# Altium footprint library Supernova.PcbLib: 77 footprints (part 6 of 6)
Each footprint in its own frame and in the unit in brackets; x right, y up, seen from the top. Pads: shape width x height; smd on the part's side, far side on the other; paste and mask are expansions set on the pad; w line width, h text height; cw(c..) or ccw(c..) is an arc to the next point about the centre after c.
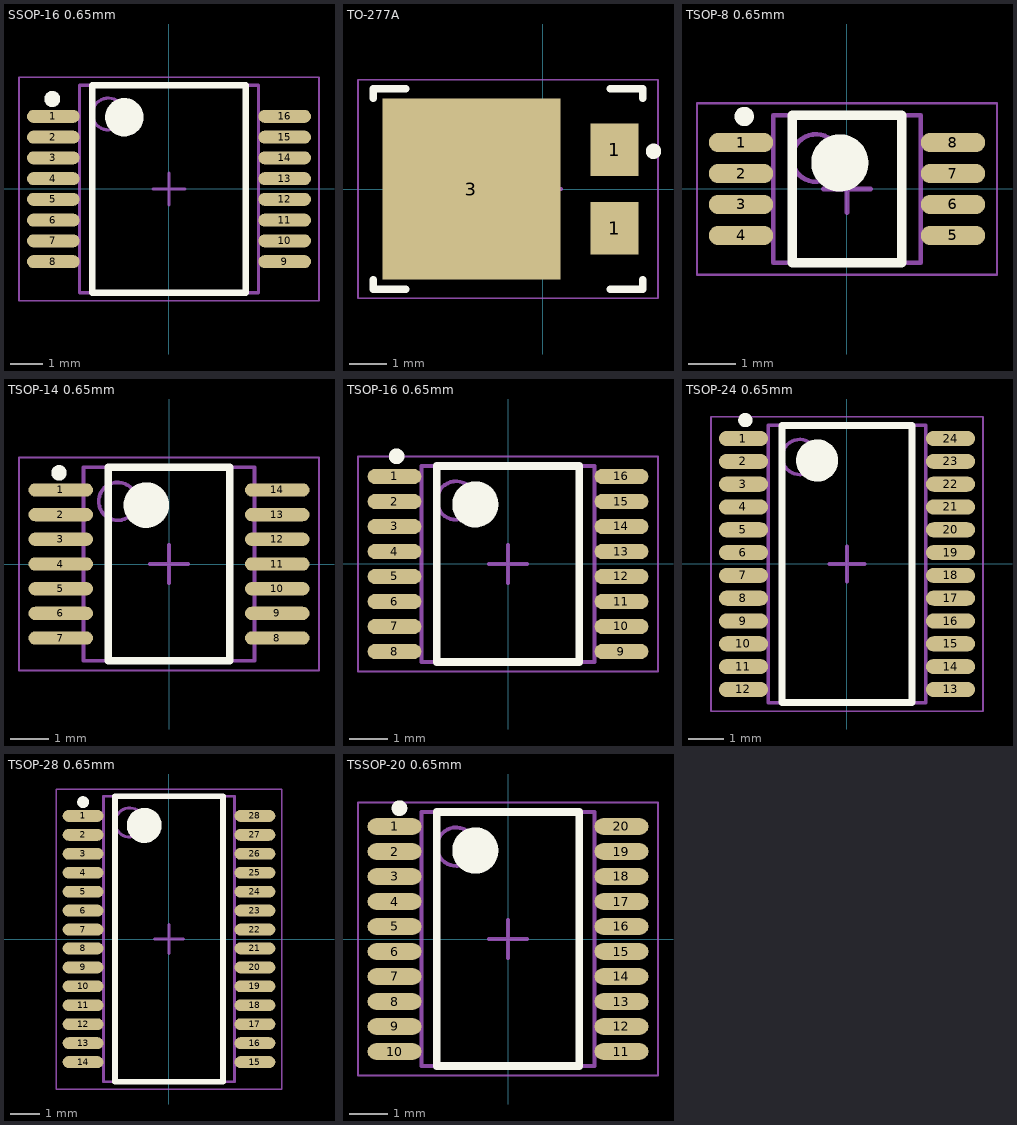
[diagram p5: the footprints below, top view; thin cyan lines are the x and y axes]

## SSOP-16 0.65mm [mm] "SOP, 16-Leads, Body 6.20x5.30mm, Pitch 0.65mm, IPC Medium Density"
height 2
pads (16):
  oval 1.65x0.406 smd mask+0.025: 1(-3.625,2.275) 2(-3.625,1.625) 3(-3.625,0.975) 4(-3.625,0.325) 5(-3.625,-0.325) 6(-3.625,-0.975) 7(-3.625,-1.625) 8(-3.625,-2.275) 9(3.625,-2.275) 10(3.625,-1.625) 11(3.625,-0.975) 12(3.625,-0.325) 13(3.625,0.325) 14(3.625,0.975) 15(3.625,1.625) 16(3.625,2.275)
Top Overlay:
  circle w0.6: c-1.4,2.25 r0.3
  circle w0.25: c-3.658,2.819 r0.125
  lines w0.2: -2.4,-3.25 2.4,-3.25 2.4,3.25 -2.4,3.25 -2.4,-3.25
Top 3D Body:
  circle w0.1: c-1.9,2.35 r0.5
  lines w0.1: -2.8,-3.25 2.8,-3.25 2.8,3.25 -2.8,3.25 -2.8,-3.25
Top Courtyard:
  lines w0.05: -4.7,-3.5 4.7,-3.5 4.7,3.5 -4.7,3.5 -4.7,-3.5
  lines w0.1: -0.5,0 0.5,0 ; 0,-0.5 0,0.5
3D body: height 0.2, standoff 0, extent -4,-2.45 4,-2.1
3D body: height 0.2, standoff 0, extent -4,-1.8 4,-1.45
3D body: height 0.2, standoff 0, extent -4,-1.15 4,-0.8
3D body: height 0.2, standoff 0, extent -4,-0.5 4,-0.15
3D body: height 0.2, standoff 0, extent -4,2.1 4,2.45
3D body: height 0.2, standoff 0, extent -4,1.45 4,1.8
3D body: height 0.2, standoff 0, extent -4,0.8 4,1.15
3D body: height 2, standoff 0.05, extent -2.8,-3.25 2.8,3.25
3D body: height 0.2, standoff 0, extent -4,0.15 4,0.5

## TO-277A [mm]
pads (3):
  rect 1.27x1.4 smd paste-0.1: 1(1.903,-1.04) 1(1.903,1.04)
  rect 4.72x4.8 smd paste-3: 3(-1.9,0)
Top Overlay:
  circle w0.203: c2.933,1 r0.102
  lines w0.2: -4.502,-2.405 -4.502,-2.655 -3.637,-2.655 ; -4.502,2.405 -4.502,2.655 -3.637,2.655 ; 1.783,-2.655 2.648,-2.655 2.648,-2.405 ; 1.783,2.655 2.648,2.655 2.648,2.405
Top Paste:
  rectangle: -4,0.1 -2,2.1
  region: 0.2,2.1 -1.8,2.1 -1.8,0.1 0.2,0.1
  region: 0.2,-2.1 0.2,-0.1 -1.8,-0.1 -1.8,-2.1
  region: -2,-2.1 -2,-0.1 -4,-0.1 -4,-2.1
Top Courtyard:
  lines w0.05: -4.907,-2.9 3.053,-2.9 3.053,2.9 -4.907,2.9 -4.907,-2.9
  lines w0.1: -0.48,0 0.48,0 ; 0,-0.48 0,0.48
3D body: height 1.2, standoff 0.1, extent -4.177,-2.362 2.473,2.363

## TSOP-8 0.65mm [mm] "TSOP, 8-Leads, Body 3.00x3.00mm, Pitch 0.65mm, IPC Medium Density"
height 1.1
pads (8):
  oval 1.35x0.406 smd mask+0.025: 1(-2.225,0.975) 2(-2.225,0.325) 3(-2.225,-0.325) 4(-2.225,-0.975) 5(2.225,-0.975) 6(2.225,-0.325) 7(2.225,0.325) 8(2.225,0.975)
Top Overlay:
  circle w0.203: c-2.159,1.524 r0.102
  circle w0.6: c-0.15,0.55 r0.3
  lines w0.2: -1.15,-1.55 -1.15,1.55 1.15,1.55 1.15,-1.55 -1.15,-1.55
Top 3D Body:
  circle w0.1: c-0.65,0.65 r0.5
  lines w0.1: -1.55,-1.55 -1.55,1.55 1.55,1.55 1.55,-1.55 -1.55,-1.55
Top Courtyard:
  lines w0.05: -3.15,-1.8 -3.15,1.8 3.15,1.8 3.15,-1.8 -3.15,-1.8
  lines w0.1: -0.5,0 0.5,0 ; 0,-0.5 0,0.5
3D body "User Library-TSSOP8-1.step": height 1.1, standoff 0, extent -2.05,-1.55 2.05,1.55

## TSOP-14 0.65mm [mm] "TSOP, 14-Leads, Body 5.00x4.40mm, Pitch 0.65mm, IPC Medium Density"
height 1.2
pads (14):
  oval 1.7x0.35 smd mask+0.025: 1(-2.85,1.95) 2(-2.85,1.3) 3(-2.85,0.65) 4(-2.85,0) 5(-2.85,-0.65) 6(-2.85,-1.3) 7(-2.85,-1.95) 8(2.85,-1.95) 9(2.85,-1.3) 10(2.85,-0.65) 11(2.85,0) 12(2.85,0.65) 13(2.85,1.3) 14(2.85,1.95)
Top Overlay:
  circle w0.6: c-0.6,1.55 r0.3
  circle w0.203: c-2.897,2.4 r0.102
  lines w0.2: -1.6,-2.55 -1.6,2.55 1.6,2.55 1.6,-2.55 -1.6,-2.55
Top 3D Body:
  circle w0.1: c-1.35,1.65 r0.5
  lines w0.1: -2.25,-2.55 -2.25,2.55 2.25,2.55 2.25,-2.55 -2.25,-2.55
Top Courtyard:
  lines w0.05: -3.95,-2.8 -3.95,2.8 3.95,2.8 3.95,-2.8 -3.95,-2.8
  lines w0.1: -0.5,0 0.5,0 ; 0,-0.5 0,0.5
3D body: height 1.2, standoff 0.1, extent -2.25,-2.55 2.25,2.55
3D body: height 0.2, standoff 0, extent -3,1.775 3,2.125
3D body: height 0.2, standoff 0, extent -3,1.125 3,1.475
3D body: height 0.2, standoff 0, extent -3,0.475 3,0.825
3D body: height 0.2, standoff 0, extent -3,-0.175 3,0.175
3D body: height 0.2, standoff 0, extent -3,-0.825 3,-0.475
3D body: height 0.2, standoff 0, extent -3,-2.125 3,-1.775
3D body: height 0.2, standoff 0, extent -3,-1.475 3,-1.125

## TSOP-16 0.65mm [mm]
height 1.1
pads (16):
  oval 1.4x0.4 smd mask+0.02: 1(-2.95,2.275) 2(-2.95,1.625) 3(-2.95,0.975) 4(-2.95,0.325) 5(-2.95,-0.325) 6(-2.95,-0.975) 7(-2.95,-1.625) 8(-2.95,-2.275) 9(2.95,-2.275) 10(2.95,-1.625) 11(2.95,-0.975) 12(2.95,-0.325) 13(2.95,0.325) 14(2.95,0.975) 15(2.95,1.625) 16(2.95,2.275)
Top Overlay:
  circle w0.6: c-0.85,1.55 r0.3
  circle w0.203: c-2.897,2.8 r0.102
  lines w0.2: -1.85,-2.55 1.85,-2.55 1.85,2.55 -1.85,2.55 -1.85,-2.55
Top 3D Body:
  circle w0.1: c-1.35,1.65 r0.5
  lines w0.1: -2.25,-2.55 2.25,-2.55 2.25,2.55 -2.25,2.55 -2.25,-2.55
Top Courtyard:
  lines w0.05: -3.9,-2.8 3.9,-2.8 3.9,2.8 -3.9,2.8 -3.9,-2.8
  lines w0.1: -0.5,0 0.5,0 ; 0,-0.5 0,0.5
3D body: height 1.1, standoff 0, extent -2.25,-2.55 2.25,2.55
3D body: height 0.2, standoff 0, extent -3.25,2.1 3.25,2.45
3D body: height 0.2, standoff 0, extent -3.25,1.45 3.25,1.8
3D body: height 0.2, standoff 0, extent -3.25,0.8 3.25,1.15
3D body: height 0.2, standoff 0, extent -3.25,0.15 3.25,0.5
3D body: height 0.2, standoff 0, extent -3.25,-0.5 3.25,-0.15
3D body: height 0.2, standoff 0, extent -3.25,-1.15 3.25,-0.8
3D body: height 0.2, standoff 0, extent -3.25,-1.8 3.25,-1.45
3D body: height 0.2, standoff 0, extent -3.25,-2.45 3.25,-2.1

## TSOP-24 0.65mm [mm] "TSOP, 24-Leads, Body 7.80x4.40mm, Pitch 0.65mm, IPC Medium Density"
height 1.2
pads (24):
  oval 1.4x0.432 smd mask+0.025: 1(-2.95,3.575) 2(-2.95,2.925) 3(-2.95,2.275) 4(-2.95,1.625) 5(-2.95,0.975) 6(-2.95,0.325) 7(-2.95,-0.325) 8(-2.95,-0.975) 9(-2.95,-1.625) 10(-2.95,-2.275) 11(-2.95,-2.925) 12(-2.95,-3.575) 13(2.95,-3.575) 14(2.95,-2.925) 15(2.95,-2.275) 16(2.95,-1.625) 17(2.95,-0.975) 18(2.95,-0.325) 19(2.95,0.325) 20(2.95,0.975) 21(2.95,1.625) 22(2.95,2.275) 23(2.95,2.925) 24(2.95,3.575)
Top Overlay:
  circle w0.6: c-0.85,2.95 r0.3
  circle w0.203: c-2.897,4.1 r0.102
  lines w0.2: -1.85,-3.95 1.85,-3.95 1.85,3.95 -1.85,3.95 -1.85,-3.95
Top 3D Body:
  circle w0.1: c-1.35,3.05 r0.5
  lines w0.1: -2.25,-3.95 2.25,-3.95 2.25,3.95 -2.25,3.95 -2.25,-3.95
Top Courtyard:
  lines w0.05: -3.875,-4.2 3.875,-4.2 3.875,4.2 -3.875,4.2 -3.875,-4.2
  lines w0.1: -0.5,0 0.5,0 ; 0,-0.5 0,0.5
3D body: height 1.2, standoff 0.1, extent -2.25,-3.95 2.25,3.95
3D body: height 0.2, standoff 0, extent -3.25,3.4 3.25,3.75
3D body: height 0.2, standoff 0, extent -3.25,2.75 3.25,3.1
3D body: height 0.2, standoff 0, extent -3.25,2.1 3.25,2.45
3D body: height 0.2, standoff 0, extent -3.25,1.45 3.25,1.8
3D body: height 0.2, standoff 0, extent -3.25,0.8 3.25,1.15
3D body: height 0.2, standoff 0, extent -3.25,0.15 3.25,0.5
3D body: height 0.2, standoff 0, extent -3.25,-0.5 3.25,-0.15
3D body: height 0.2, standoff 0, extent -3.25,-1.15 3.25,-0.8
3D body: height 0.2, standoff 0, extent -3.25,-1.8 3.25,-1.45
3D body: height 0.2, standoff 0, extent -3.25,-2.45 3.25,-2.1
3D body: height 0.2, standoff 0, extent -3.25,-3.1 3.25,-2.75
3D body: height 0.2, standoff 0, extent -3.25,-3.75 3.25,-3.4

## TSOP-28 0.65mm [mm] "TSOP, 28-Leads, Body 9.70x4.40mm, Pitch 0.65mm, IPC Medium Density"
height 1.2
pads (28):
  oval 1.4x0.406 smd mask+0.025: 1(-2.95,4.225) 2(-2.95,3.575) 3(-2.95,2.925) 4(-2.95,2.275) 5(-2.95,1.625) 6(-2.95,0.975) 7(-2.95,0.325) 8(-2.95,-0.325) 9(-2.95,-0.975) 10(-2.95,-1.625) 11(-2.95,-2.275) 12(-2.95,-2.925) 13(-2.95,-3.575) 14(-2.95,-4.225) 15(2.95,-4.225) 16(2.95,-3.575) 17(2.95,-2.925) 18(2.95,-2.275) 19(2.95,-1.625) 20(2.95,-0.975) 21(2.95,-0.325) 22(2.95,0.325) 23(2.95,0.975) 24(2.95,1.625) 25(2.95,2.275) 26(2.95,2.925) 27(2.95,3.575) 28(2.95,4.225)
Top Overlay:
  circle w0.203: c-2.95,4.7 r0.102
  circle w0.6: c-0.85,3.9 r0.3
  lines w0.2: -1.85,-4.9 1.85,-4.9 1.85,4.9 -1.85,4.9 -1.85,-4.9
Top 3D Body:
  circle w0.1: c-1.35,4 r0.5
  lines w0.1: -2.25,-4.9 2.25,-4.9 2.25,4.9 -2.25,4.9 -2.25,-4.9
Top Courtyard:
  lines w0.05: -3.875,-5.15 3.875,-5.15 3.875,5.15 -3.875,5.15 -3.875,-5.15
  lines w0.1: -0.5,0 0.5,0 ; 0,-0.5 0,0.5
3D body: height 1.2, standoff 0.05, extent -2.25,-4.9 2.25,4.9
3D body: height 0.3, standoff 0, extent -3.121,4.111 3.048,4.339
3D body: height 0.3, standoff 0, extent -3.121,3.461 3.048,3.689
3D body: height 0.3, standoff 0, extent -3.121,2.811 3.048,3.039
3D body: height 0.3, standoff 0, extent -3.121,2.161 3.048,2.389
3D body: height 0.3, standoff 0, extent -3.121,1.511 3.048,1.739
3D body: height 0.3, standoff 0, extent -3.121,0.861 3.048,1.089
3D body: height 0.3, standoff 0, extent -3.121,0.211 3.048,0.439
3D body: height 0.3, standoff 0, extent -3.121,-0.439 3.048,-0.211
3D body: height 0.3, standoff 0, extent -3.121,-1.089 3.048,-0.861
3D body: height 0.3, standoff 0, extent -3.121,-1.739 3.048,-1.511
3D body: height 0.3, standoff 0, extent -3.121,-2.389 3.048,-2.161
3D body: height 0.3, standoff 0, extent -3.121,-3.039 3.048,-2.811
3D body: height 0.3, standoff 0, extent -3.121,-3.689 3.048,-3.461
3D body: height 0.3, standoff 0, extent -3.121,-4.339 3.048,-4.111

## TSSOP-20 0.65mm [mm] "TSOP, 20-Leads, Body 6.50x4.40mm, Pitch 0.65mm, IPC Medium Density"
height 1.2
pads (20):
  oval 1.4x0.43 smd mask+0.025: 1(-2.95,2.925) 2(-2.95,2.275) 3(-2.95,1.625) 4(-2.95,0.975) 5(-2.95,0.325) 6(-2.95,-0.325) 7(-2.95,-0.975) 8(-2.95,-1.625) 9(-2.95,-2.275) 10(-2.95,-2.925) 11(2.95,-2.925) 12(2.95,-2.275) 13(2.95,-1.625) 14(2.95,-0.975) 15(2.95,-0.325) 16(2.95,0.325) 17(2.95,0.975) 18(2.95,1.625) 19(2.95,2.275) 20(2.95,2.925)
Top Overlay:
  circle w0.203: c-2.822,3.4 r0.102
  circle w0.6: c-0.85,2.3 r0.3
  lines w0.2: -1.85,-3.3 -1.85,3.3 1.85,3.3 1.85,-3.3 -1.85,-3.3
Top 3D Body:
  circle w0.1: c-1.35,2.4 r0.5
  lines w0.1: -2.25,-3.3 -2.25,3.3 2.25,3.3 2.25,-3.3 -2.25,-3.3
Top Courtyard:
  lines w0.05: -3.9,-3.55 -3.9,3.55 3.9,3.55 3.9,-3.55 -3.9,-3.55
  lines w0.1: -0.5,0 0.5,0 ; 0,-0.5 0,0.5
3D body: height 0.2, standoff 0, extent -3.325,-3.075 3.3,-2.775
3D body: height 0.2, standoff 0, extent -3.325,-2.425 3.3,-2.125
3D body: height 0.2, standoff 0, extent -3.325,-1.775 3.3,-1.475
3D body: height 0.2, standoff 0, extent -3.325,-1.125 3.3,-0.825
3D body: height 0.2, standoff 0, extent -3.325,-0.475 3.3,-0.175
3D body: height 0.2, standoff 0, extent -3.325,0.175 3.3,0.475
3D body: height 0.2, standoff 0, extent -3.325,0.825 3.3,1.125
3D body: height 0.2, standoff 0, extent -3.325,1.475 3.3,1.775
3D body: height 0.2, standoff 0, extent -3.325,2.125 3.3,2.425
3D body: height 0.2, standoff 0, extent -3.325,2.775 3.3,3.075
3D body: height 1.2, standoff 0.05, extent -2.25,-3.3 2.25,3.3